# Altium footprint library SG__PCB_Modules.PcbLib: 73 footprints (part 4 of 5)
Each footprint in its own frame and in the unit in brackets; x right, y up, seen from the top. Pads: shape width x height; smd on the part's side, far side on the other; paste and mask are expansions set on the pad; w line width, h text height; cw(c..) or ccw(c..) is an arc to the next point about the centre after c.
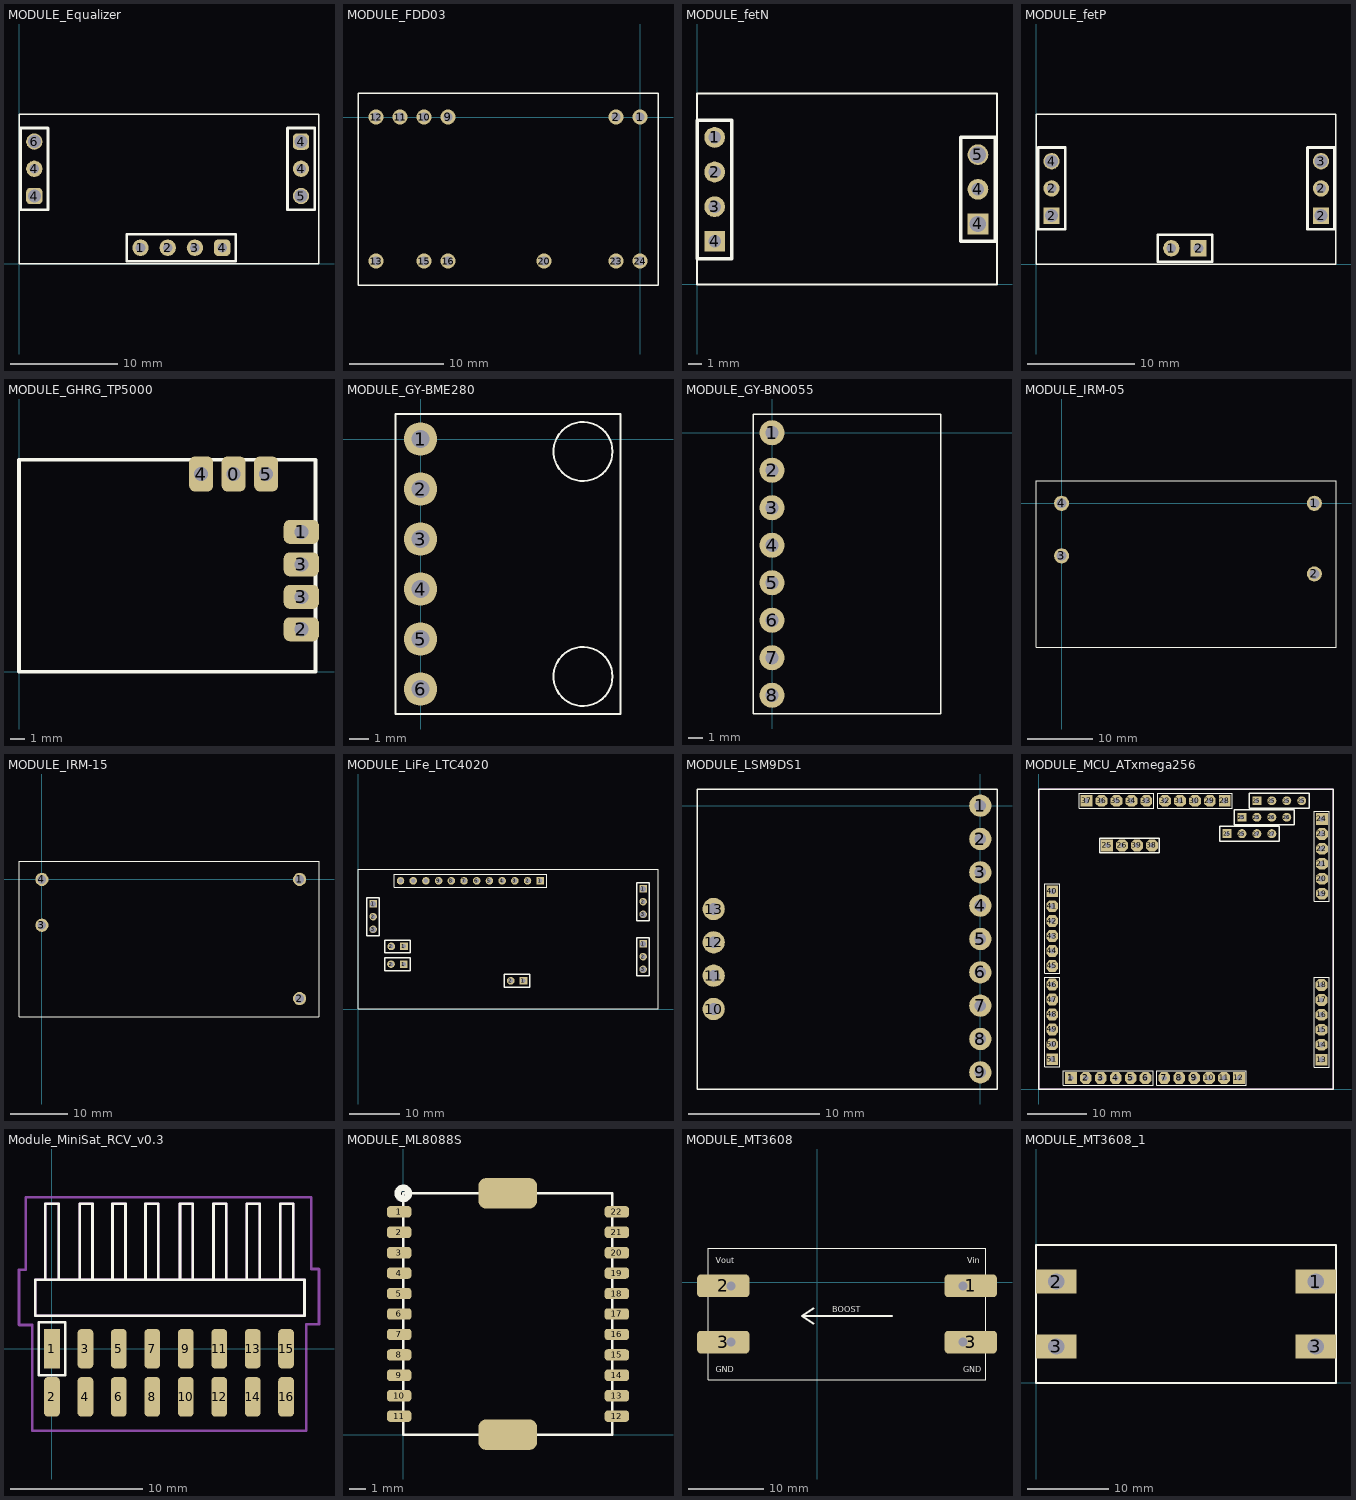
[diagram p3: the footprints below, top view; thin cyan lines are the x and y axes]

## MODULE_Equalizer [mil]
pads (10):
  round 60 hole 35.43: 1(446.38,59.76) 2(546.38,59.76) 3(646.38,59.76) 4(56.38,349.76) 4(1036.38,349.76)
  rrect50% 60x60 hole 47.24: 4(56.38,249.76) 4(1036.38,449.76)
  rrect50% 60x60 hole 35.43: 4(746.38,59.76)
  round 60 hole 47.24: 5(1036.38,249.76) 6(56.38,449.76)
Top Overlay:
  lines w5: 0,0 0,551.18 1102.36,551.18 1102.36,0 0,0
  lines w10: 6.38,199.76 6.38,499.76 106.38,499.76 106.38,199.76 6.38,199.76 ; 396.38,9.76 796.38,9.76 796.38,109.76 396.38,109.76 396.38,9.76 ; 986.38,199.76 986.38,499.76 1086.38,499.76 1086.38,199.76 986.38,199.76
3D body "PLS1.stp": height 336.22, standoff -118.11, extent 396.38,9.76 496.38,109.76
3D body "PLS1.stp": height 336.22, standoff -118.11, extent 496.38,9.76 596.38,109.76
3D body "PLS1.stp": height 336.22, standoff -118.11, extent 596.38,9.76 696.38,109.76
3D body "PLS1.stp": height 336.22, standoff -118.11, extent 696.38,9.76 796.38,109.76
3D body "PLS1.stp": height 336.22, standoff -118.11, extent 6.38,199.77 106.38,299.77
3D body "PLS1.stp": height 336.22, standoff -118.11, extent 6.38,299.77 106.38,399.77
3D body "PLS1.stp": height 336.22, standoff -118.11, extent 6.38,399.77 106.38,499.77
3D body "PLS1.stp": height 336.22, standoff -118.11, extent 986.38,399.76 1086.38,499.76
3D body "PLS1.stp": height 336.22, standoff -118.11, extent 986.38,299.76 1086.38,399.76
3D body "PLS1.stp": height 336.22, standoff -118.11, extent 986.38,199.76 1086.38,299.76

## MODULE_FDD03 [mm]
pads (12):
  round 1.6 hole 0.9 paste-2539.97 mask-0.05: 1(0,0) 2(-2.54,0) 9(-20.32,0) 10(-22.86,0) 11(-25.4,0) 12(-27.94,0) 13(-27.94,-15.24) 15(-22.86,-15.24) 16(-20.32,-15.24) 20(-10.16,-15.24) 23(-2.54,-15.24) 24(0,-15.24)
Top Overlay:
  lines w0.152: -29.845,-6.985 -29.845,-1.905 ; -10.16,2.54 -2.54,2.54 ; 1.905,-2.54 1.905,-7.62 ; -29.845,-1.905 -29.845,-17.78 -10.16,-17.78 -2.54,-17.78 1.905,-17.78 1.905,-7.62 ; -29.845,-1.905 -29.845,2.54 -2.54,2.54 ; -2.54,2.54 1.905,2.54 1.905,-7.62
3D body: height 13.7, standoff 1, extent -29.845,-17.78 1.905,2.54

## MODULE_fetN [mil]
pads (7):
  round 60 hole 35.43: 1(50.94,424.65) 2(50.94,324.65) 3(50.94,224.65) 4(810.94,274.65)
  rect 60x60 hole 35.43: 4(50.94,124.65)
  rect 60x60 hole 47.24: 4(810.94,174.65)
  round 60 hole 47.24: 5(810.94,374.65)
Top Overlay:
  lines w5: 0,0 0,551.18 866.14,551.18 866.14,0 0,0
  lines w10: 0.94,74.65 100.94,74.65 100.94,474.65 0.94,474.65 0.94,74.65 ; 760.94,124.65 760.94,424.65 860.94,424.65 860.94,124.65 760.94,124.65
3D body "PLS1.stp": height 336.22, standoff -118.11, extent 760.94,124.65 860.94,224.65
3D body "PLS1.stp": height 336.22, standoff -118.11, extent 760.94,224.65 860.94,324.65
3D body "PLS1.stp": height 336.22, standoff -118.11, extent 760.94,324.65 860.94,424.65
3D body "PLS1.stp": height 336.22, standoff -118.11, extent 0.94,374.65 100.94,474.65
3D body "PLS1.stp": height 336.22, standoff -118.11, extent 0.94,274.65 100.94,374.65
3D body "PLS1.stp": height 336.22, standoff -118.11, extent 0.94,174.65 100.94,274.65
3D body "PLS1.stp": height 336.22, standoff -118.11, extent 0.94,74.65 100.94,174.65

## MODULE_fetP [mil]
pads (8):
  round 60 hole 35.43: 1(497.24,57.8) 2(57.24,277.8) 2(1047.24,277.8)
  rect 60x60 hole 47.24: 2(57.24,177.8) 2(1047.24,177.8)
  rect 60x60 hole 35.43: 2(597.24,57.8)
  round 60 hole 47.24: 3(1047.24,377.8) 4(57.24,377.8)
Top Overlay:
  lines w5: 0,0 0,551.18 1102.36,551.18 1102.36,0 0,0
  lines w10: 7.24,127.8 107.24,127.8 107.24,427.8 7.24,427.8 7.24,127.8 ; 447.24,7.8 447.24,107.8 647.24,107.8 647.24,7.8 447.24,7.8 ; 997.24,127.8 1097.24,127.8 1097.24,427.8 997.24,427.8 997.24,127.8
3D body "PLS1.stp": height 336.22, standoff -118.11, extent 447.24,7.79 547.24,107.79
3D body "PLS1.stp": height 336.22, standoff -118.11, extent 547.24,7.79 647.24,107.79
3D body "PLS1.stp": height 336.22, standoff -118.11, extent 7.24,327.8 107.24,427.8
3D body "PLS1.stp": height 336.22, standoff -118.11, extent 7.24,227.8 107.24,327.8
3D body "PLS1.stp": height 336.22, standoff -118.11, extent 7.24,127.8 107.24,227.8
3D body "PLS1.stp": height 336.22, standoff -118.11, extent 997.24,327.8 1097.24,427.8
3D body "PLS1.stp": height 336.22, standoff -118.11, extent 997.24,227.8 1097.24,327.8
3D body "PLS1.stp": height 336.22, standoff -118.11, extent 997.24,127.8 1097.24,227.8

## MODULE_GHRG_TP5000 [mm]
pads (7):
  rrect50% 1.7x2.5 hole 1: 0(15.2,14) 4(12.9,14) 5(17.5,14)
  rrect50% 2.5x1.7 hole 1: 1(20,9.9) 2(20,3) 3(20,5.3) 3(20,7.6)
Top Overlay:
  lines w0.254: 0,0 0,15 21,15 21,0 0,0

## MODULE_GY-BME280 [mm]
pads (6):
  round 1.7 hole 0.9 paste-2539.97 mask-0.05: 1(0,0) 2(0,-2.54) 3(0,-5.08) 4(0,-7.62) 5(0,-10.16) 6(0,-12.7)
Top Overlay:
  circle w0.102: c8.255,-12.065 r1.5
  circle w0.102: c8.255,-0.635 r1.5
  lines w0.102: -1.27,-13.97 10.16,-13.97 10.16,1.27 -1.27,1.27 -1.27,-13.97
3D body: height 4.5, standoff 3, extent -1.27,-13.97 10.16,1.27
3D body "PLS1.stp": height 8.54, standoff -3, extent -1.27,-1.27 1.27,1.27
3D body "PLS1.stp": height 8.54, standoff -3, extent -1.27,-3.81 1.27,-1.27
3D body "PLS1.stp": height 8.54, standoff -3, extent -1.27,-6.35 1.27,-3.81
3D body "PLS1.stp": height 8.54, standoff -3, extent -1.27,-8.89 1.27,-6.35
3D body "PLS1.stp": height 8.54, standoff -3, extent -1.27,-11.43 1.27,-8.89
3D body "PLS1.stp": height 8.54, standoff -3, extent -1.27,-13.97 1.27,-11.43

## MODULE_GY-BNO055 [mm]
pads (8):
  round 1.7 hole 0.9 paste-2539.97 mask-0.05: 1(0,0) 2(0,-2.54) 3(0,-5.08) 4(0,-7.62) 5(0,-10.16) 6(0,-12.7) 7(0,-15.24) 8(0,-17.78)
Top Overlay:
  lines w0.102: -1.27,-19.05 -1.27,1.27 11.43,1.27 11.43,-19.05 -1.27,-19.05
3D body "PLS1.stp": height 8.54, standoff -3, extent -1.27,-1.27 1.27,1.27
3D body "PLS1.stp": height 8.54, standoff -3, extent -1.27,-3.81 1.27,-1.27
3D body "PLS1.stp": height 8.54, standoff -3, extent -1.27,-6.35 1.27,-3.81
3D body "PLS1.stp": height 8.54, standoff -3, extent -1.27,-8.89 1.27,-6.35
3D body "PLS1.stp": height 8.54, standoff -3, extent -1.27,-11.43 1.27,-8.89
3D body "PLS1.stp": height 8.54, standoff -3, extent -1.27,-13.97 1.27,-11.43
3D body "PLS1.stp": height 8.54, standoff -3, extent -1.27,-16.51 1.27,-13.97
3D body "PLS1.stp": height 8.54, standoff -3, extent -1.27,-19.05 1.27,-16.51
3D body: height 4.5, standoff 3, extent -1.27,-19.05 11.43,1.27

## MODULE_IRM-05 [mm]
pads (4):
  round 2.3 hole 1.5 paste-2539.97 mask-0.05: 1(38.5,0) 2(38.5,-10.75) 3(0,-8) 4(0,0)
Top Overlay:
  lines w0.152: -3.9,-21.95 41.8,-21.95 41.8,3.45 -3.9,3.45 -3.9,-21.95
3D body: height 22.5, standoff 1, extent -3.9,-21.95 41.8,3.45

## MODULE_IRM-15 [mm]
pads (4):
  round 2.3 hole 1.5 paste-2539.97 mask-0.05: 1(45,0) 2(45,-20.8) 3(0,-8) 4(0,0)
Top Overlay:
  lines w0.152: -4,-24 -4,3.2 48.4,3.2 48.4,-24 -4,-24
3D body: height 25, standoff 1, extent -4,-24 48.4,3.2

## MODULE_LiFe_LTC4020 [mm]
pads (27):
  rect 1.524x1.524 hole 1.2: 1(3.004,21.039) 1(57.004,13.039) 1(57.004,24.039)
  rect 1.524x1.524 hole 0.9: 1(9.119,8.989) 1(9.169,12.539) 1(33.071,5.664)
  rect 1.5x1.5 hole 0.9: 1(36.424,25.669)
  round 1.524 hole 0.9: 2(3.004,18.499) 2(6.579,8.989) 2(6.629,12.539) 2(30.531,5.664) 2(57.004,10.499) 2(57.004,21.499)
  round 1.5 hole 0.9: 2(33.884,25.669) 3(31.344,25.669) 4(28.804,25.669) 5(26.264,25.669) 6(23.724,25.669) 7(21.184,25.669) 8(18.644,25.669) 9(16.104,25.669) 10(13.564,25.669) 11(11.024,25.669) 12(8.484,25.669)
  round 1.524 hole 1.2: 3(3.004,15.959) 3(57.004,7.959) 3(57.004,18.959)
Top Overlay:
  lines w0.127: -0.022,0.024 -0.022,28.024 59.978,28.024 59.978,0.024 -0.022,0.024
  lines w0.2: 7.214,24.399 35.789,24.399 37.694,24.399 37.694,26.939 7.214,26.939 7.214,24.399
  lines w0.254: 1.734,14.689 1.734,22.309 4.274,22.309 4.274,14.689 1.734,14.689 ; 5.309,7.719 10.389,7.719 10.389,10.259 5.309,10.259 5.309,7.719 ; 5.359,11.269 10.439,11.269 10.439,13.809 5.359,13.809 5.359,11.269 ; 29.261,4.394 34.341,4.394 34.341,6.934 29.261,6.934 29.261,4.394 ; 55.734,6.689 55.734,14.309 58.274,14.309 58.274,6.689 55.734,6.689 ; 55.734,17.689 55.734,25.309 58.274,25.309 58.274,17.689 55.734,17.689
3D body "PLS1.stp": height 8.54, standoff -3, extent 7.849,7.719 10.389,10.259
3D body "PLS1.stp": height 8.54, standoff -3, extent 5.309,7.719 7.849,10.259
3D body "PLS1.stp": height 8.54, standoff -3, extent 7.899,11.269 10.439,13.809
3D body "PLS1.stp": height 8.54, standoff -3, extent 5.359,11.269 7.899,13.809
3D body "PLS1.stp": height 8.54, standoff -3, extent 31.801,4.394 34.341,6.934
3D body "PLS1.stp": height 8.54, standoff -3, extent 29.261,4.394 31.801,6.934
3D body "PLS1.stp": height 8.54, standoff -3, extent 1.734,19.769 4.274,22.309
3D body "PLS1.stp": height 8.54, standoff -3, extent 1.734,17.229 4.274,19.769
3D body "PLS1.stp": height 8.54, standoff -3, extent 1.734,14.689 4.274,17.229
3D body "PLS1.stp": height 8.54, standoff -3, extent 55.734,22.769 58.274,25.309
3D body "PLS1.stp": height 8.54, standoff -3, extent 55.734,20.229 58.274,22.769
3D body "PLS1.stp": height 8.54, standoff -3, extent 55.734,17.689 58.274,20.229
3D body "PLS1.stp": height 8.54, standoff -3, extent 55.734,11.769 58.274,14.309
3D body "PLS1.stp": height 8.54, standoff -3, extent 55.734,9.229 58.274,11.769
3D body "PLS1.stp": height 8.54, standoff -3, extent 55.734,6.689 58.274,9.229

## MODULE_LSM9DS1 [mm]
pads (13):
  round 1.7 hole 0.9 paste-2539.97 mask-0.05: 1(0,0) 2(0,-2.54) 3(0,-5.08) 4(0,-7.62) 5(0,-10.16) 6(0,-12.7) 7(0,-15.24) 8(0,-17.78) 9(0,-20.32) 10(-20.32,-15.494) 11(-20.32,-12.954) 12(-20.32,-10.414) 13(-20.32,-7.874)
Top Overlay:
  lines w0.102: -21.59,-21.59 1.27,-21.59 1.27,1.27 -21.59,1.27 -21.59,-21.59
3D body "PLS1.stp": height 8.54, standoff -3, extent -21.59,-9.144 -19.05,-6.604
3D body "PLS1.stp": height 8.54, standoff -3, extent -21.59,-11.684 -19.05,-9.144
3D body "PLS1.stp": height 8.54, standoff -3, extent -21.59,-14.224 -19.05,-11.684
3D body "PLS1.stp": height 8.54, standoff -3, extent -21.59,-16.764 -19.05,-14.224
3D body "PLS1.stp": height 8.54, standoff -3, extent -1.27,-1.27 1.27,1.27
3D body "PLS1.stp": height 8.54, standoff -3, extent -1.27,-3.81 1.27,-1.27
3D body "PLS1.stp": height 8.54, standoff -3, extent -1.27,-6.35 1.27,-3.81
3D body "PLS1.stp": height 8.54, standoff -3, extent -1.27,-8.89 1.27,-6.35
3D body "PLS1.stp": height 8.54, standoff -3, extent -1.27,-11.43 1.27,-8.89
3D body "PLS1.stp": height 8.54, standoff -3, extent -1.27,-13.97 1.27,-11.43
3D body "PLS1.stp": height 8.54, standoff -3, extent -1.27,-16.51 1.27,-13.97
3D body "PLS1.stp": height 8.54, standoff -3, extent -1.27,-19.05 1.27,-16.51
3D body "PLS1.stp": height 8.54, standoff -3, extent -1.27,-21.59 1.27,-19.05
3D body: height 4.5, standoff 3, extent -21.59,-21.59 1.27,1.27

## MODULE_MCU_ATxmega256 [mm]
pads (62):
  rect 2x2 hole 0.9: 1(5.429,1.873) 12(34.004,1.873) 13(48.041,4.985) 24(48.101,45.909) 28(31.591,48.99) 37(8.096,48.99) 40(2.254,33.623) 51(2.254,5.048)
  oct 2x2 hole 0.9: 2(7.969,1.873) 3(10.509,1.873) 4(13.049,1.873) 5(15.589,1.873) 6(18.129,1.873) 7(21.304,1.873) 8(23.844,1.873) 9(26.384,1.873) 10(28.924,1.873) 11(31.464,1.873) 14(48.041,7.525) 15(48.041,10.065) 16(48.041,12.605) 17(48.041,15.145) 18(48.041,17.685) 19(48.101,33.209) 20(48.101,35.749) 21(48.101,38.289) 22(48.101,40.829) 23(48.101,43.369) 29(29.051,48.99) 30(26.511,48.99) 31(23.971,48.99) 32(21.431,48.99) 33(18.256,48.99) 34(15.716,48.99) 35(13.176,48.99) 36(10.636,48.99) 41(2.254,31.083) 42(2.254,28.543) 43(2.254,26.003) 44(2.254,23.463) 45(2.254,20.923) 46(2.254,17.748) 47(2.254,15.208) 48(2.254,12.668) 49(2.254,10.128) 50(2.254,7.588)
  rect 2x2 hole 0.762: 25(11.58,41.4)
  rect 1.524x1.524 hole 0.762: 25(31.972,43.402) 25(34.512,46.196) 25(37.052,49)
  round 1.524 hole 0.762: 25(34.512,43.402) 25(37.052,46.196) 25(39.592,49) 25(42.132,49) 25(44.672,49) 26(39.592,46.196) 26(42.132,46.196) 27(37.052,43.402) 27(39.592,43.402)
  oct 2x2 hole 0.762: 26(14.12,41.4) 38(19.2,41.4) 39(16.66,41.4)
Top Overlay:
  lines w0.2: 0.984,3.778 3.524,3.778 3.524,19.018 0.984,19.018 0.984,3.778 ; 0.984,19.653 3.524,19.653 3.524,34.893 0.984,34.893 0.984,19.653 ; 4.159,0.603 4.159,3.143 19.399,3.143 19.399,0.603 4.159,0.603 ; 6.826,47.72 6.826,50.26 19.526,50.26 19.526,47.72 6.826,47.72 ; 20.034,0.603 20.034,3.143 35.274,3.143 35.274,0.603 20.034,0.603 ; 20.161,47.72 32.861,47.72 32.861,50.26 20.161,50.26 20.161,47.72 ; 46.771,3.715 49.311,3.715 49.311,18.955 46.771,18.955 46.771,3.715 ; 46.831,31.939 49.371,31.939 49.371,47.179 46.831,47.179 46.831,31.939
  lines w0.254: 0,0 0,51 50,51 ; 0,0 50,0 50,51 ; 0,0 0,0 ; 50,51 50,51 ; 10.31,40.13 20.47,40.13 20.47,42.67 10.31,42.67 10.31,40.13 ; 30.702,42.132 40.862,42.132 40.862,44.672 30.702,44.672 30.702,42.132 ; 33.242,44.926 43.402,44.926 43.402,47.466 33.242,47.466 33.242,44.926 ; 35.782,47.73 35.782,50.27 45.942,50.27 45.942,47.73 35.782,47.73
Assembly Top:
  lines w0.254: 0,0 0,51 50,51 ; 0,0 0,0 ; 0,0 50,0 50,51 ; 50,51 50,51
3D body "PLS1.stp": height 8.54, standoff -3, extent 43.402,47.73 45.942,50.27
3D body "PLS1.stp": height 8.54, standoff -3, extent 40.862,47.73 43.402,50.27
3D body "PLS1.stp": height 8.54, standoff -3, extent 38.322,47.73 40.862,50.27
3D body "PLS1.stp": height 8.54, standoff -3, extent 35.782,47.73 38.322,50.27
3D body "PLS1.stp": height 8.54, standoff -3, extent 30.702,42.132 33.242,44.672
3D body "PLS1.stp": height 8.54, standoff -3, extent 33.242,42.132 35.782,44.672
3D body "PLS1.stp": height 8.54, standoff -3, extent 35.782,42.132 38.322,44.672
3D body "PLS1.stp": height 8.54, standoff -3, extent 38.322,42.132 40.862,44.672
3D body "PLS1.stp": height 8.54, standoff -3, extent 10.31,40.13 12.85,42.67
3D body "PLS1.stp": height 8.54, standoff -3, extent 12.85,40.13 15.39,42.67
3D body "PLS1.stp": height 8.54, standoff -3, extent 15.39,40.13 17.93,42.67
3D body "PLS1.stp": height 8.54, standoff -3, extent 17.93,40.13 20.47,42.67
3D body "PLS1.stp": height 8.54, standoff -3, extent 33.242,44.926 35.782,47.466
3D body "PLS1.stp": height 8.54, standoff -3, extent 35.782,44.926 38.322,47.466
3D body "PLS1.stp": height 8.54, standoff -3, extent 38.322,44.926 40.862,47.466
3D body "PLS1.stp": height 8.54, standoff -3, extent 40.862,44.926 43.402,47.466

## Module_MiniSat_RCV_v0.3 [mm]
pads (16):
  rect 1.2x3 smd: 1(0,0)
  rrect50% 1.2x3 smd: 2(0,-3.65) 3(2.54,0) 4(2.54,-3.65) 5(5.08,0) 6(5.08,-3.65) 7(7.62,0) 8(7.62,-3.65) 9(10.16,0) 10(10.16,-3.65) 11(12.7,0) 12(12.7,-3.65) 13(15.24,0) 14(15.24,-3.65) 15(17.78,0) 16(17.78,-3.65)
Top Overlay:
  lines w0.2: -0.508,5.25 -0.508,11 0.508,11 0.508,7.112 0.508,5.25 ; 2.103,5.25 2.103,11 3.083,11 3.083,5.25 ; 4.603,5.25 4.603,11 5.583,11 5.583,5.25 ; 7.103,5.25 7.103,11 8.083,11 8.083,5.25 ; 9.723,5.25 9.723,11 10.703,11 10.703,5.25 ; 12.263,5.25 12.263,11 13.243,11 13.243,5.25 ; 14.803,5.25 14.803,11 15.783,11 15.783,5.25 ; 17.343,5.25 17.343,11 18.323,11 18.323,5.25 ; 18.323,5.25 -1.27,5.25 -1.27,2.5 18.415,2.5 19.175,2.5 19.175,5.25 18.323,5.25 ; -1,-2 1,-2 1,2 -1,2 -1,-2
Assembly Top:
  lines w0.2: -0.508,5.25 -0.508,11 0.508,11 0.508,7.112 0.508,5.25 ; 2.103,5.25 2.103,11 3.083,11 3.083,5.25 ; 4.603,5.25 4.603,11 5.583,11 5.583,5.25 ; 7.103,5.25 7.103,11 8.083,11 8.083,5.25 ; 9.723,5.25 9.723,11 10.703,11 10.703,5.25 ; 12.263,5.25 12.263,11 13.243,11 13.243,5.25 ; 14.803,5.25 14.803,11 15.783,11 15.783,5.25 ; 17.343,5.25 17.343,11 18.323,11 18.323,5.25 ; -1.27,2.5 -1.27,5.25 19.175,5.25 19.175,2.5 -1.27,2.5
Courtyard Top:
  lines w0.2: 18.169,11.5 19.7,11.5 19.7,6.058 20.275,6.058 20.275,1.858 19.3,1.858 19.3,-6.223 18.669,-6.223 -1.5,-6.223 -1.5,1.8 -2.5,1.8 -2.5,6 -2,6 -2,11.5 19.177,11.5
3D body "MiniSat2_radio_rcv0.3(JustE220).step": height 11.86, standoff -3.41, extent -15.13,6 39.63,35.421
3D body: height 5, standoff 0, extent -1.27,5.25 19.175,12.421
3D body "pin_header_a-sl254-da-g04mp1.stp": height 5, standoff -0.02, extent 8.89,-4.699 13.97,11.421
3D body "pin_header_a-sl254-da-g04mp1.stp": height 5, standoff -0.02, extent 3.81,-4.699 8.89,11.421
3D body "pin_header_a-sl254-da-g04mp1.stp": height 5, standoff -0.02, extent -1.27,-4.699 3.81,11.421
3D body "pin_header_a-sl254-da-g04mp1.stp": height 5, standoff -0.02, extent 13.97,-4.699 19.05,11.421

## MODULE_ML8088S [mm]
pads (24):
  rrect50% 1.5x0.7 smd: 1(-0.25,13.85) 2(-0.25,12.58) 3(-0.25,11.31) 4(-0.25,10.04) 5(-0.25,8.77) 6(-0.25,7.5) 7(-0.25,6.23) 8(-0.25,4.96) 9(-0.25,3.69) 10(-0.25,2.42) 11(-0.25,1.15) 12(13.275,1.15) 13(13.275,2.42) 14(13.275,3.69) 15(13.275,4.96) 16(13.275,6.23) 17(13.275,7.5) 18(13.275,8.77) 19(13.275,10.04) 20(13.275,11.31) 21(13.275,12.58) 22(13.275,13.85)
  rrect50% 3.65x1.9 smd: ""(6.5,0) ""(6.5,15)
Top Overlay:
  circle w0.4: c0,15 r0.35
  lines w0.152: 0,0 0,15 13,15 13,0 0,0
3D body: height 2.2, standoff 0.2, extent 0,0 13,15

## MODULE_MT3608 [mm]
height 5.5
pads (4):
  rrect33% 7x3 all layers, no hole mask+0.05: 1(20.5,-0.5) 2(-12.5,-0.5) 3(-12.5,-8) 3(20.5,-8)
via 19.5,-8 diameter 1.2 hole 1.2
via 19.5,-0.5 diameter 1.2 hole 1.2
via -11.5,-0.5 diameter 1.2 hole 1.2
via -11.5,-8 diameter 1.2 hole 1.2
Top Overlay:
  lines w0.152: -14.5,-13 22.5,-13 22.5,4.5 -14.5,4.5 -14.5,-13
  lines w0.3: -0.5,-5.5 -2,-4.5 ; -0.5,-3.5 -2,-4.5 ; 10,-4.5 -2,-4.5
  text "GND" at 19.5,-12 h0.76
  text "GND" at -13.5,-12 h0.76
  text "Vin" at 20,2.5 h0.76
  text "Vout" at -13.5,2.5 h0.76
  text "BOOST" at 2,-4 h0.76
3D body: height 6, standoff 0.3, extent -14.25,-12.75 22.25,4.25

## MODULE_MT3608_1 [mm]
pads (4):
  rect 5x3 hole 2: 1(34.5,12.5) 2(2.5,12.5) 3(2.5,4.5) 3(34.5,4.5)
Top Overlay:
  lines w0.254: 0,0 0,17 37,17 37,0 0,0